# Altium integrated library Altium_MCU.IntLib: 42 symbols
Pins are listed as number, name and electrical type; pins without a type are passive.

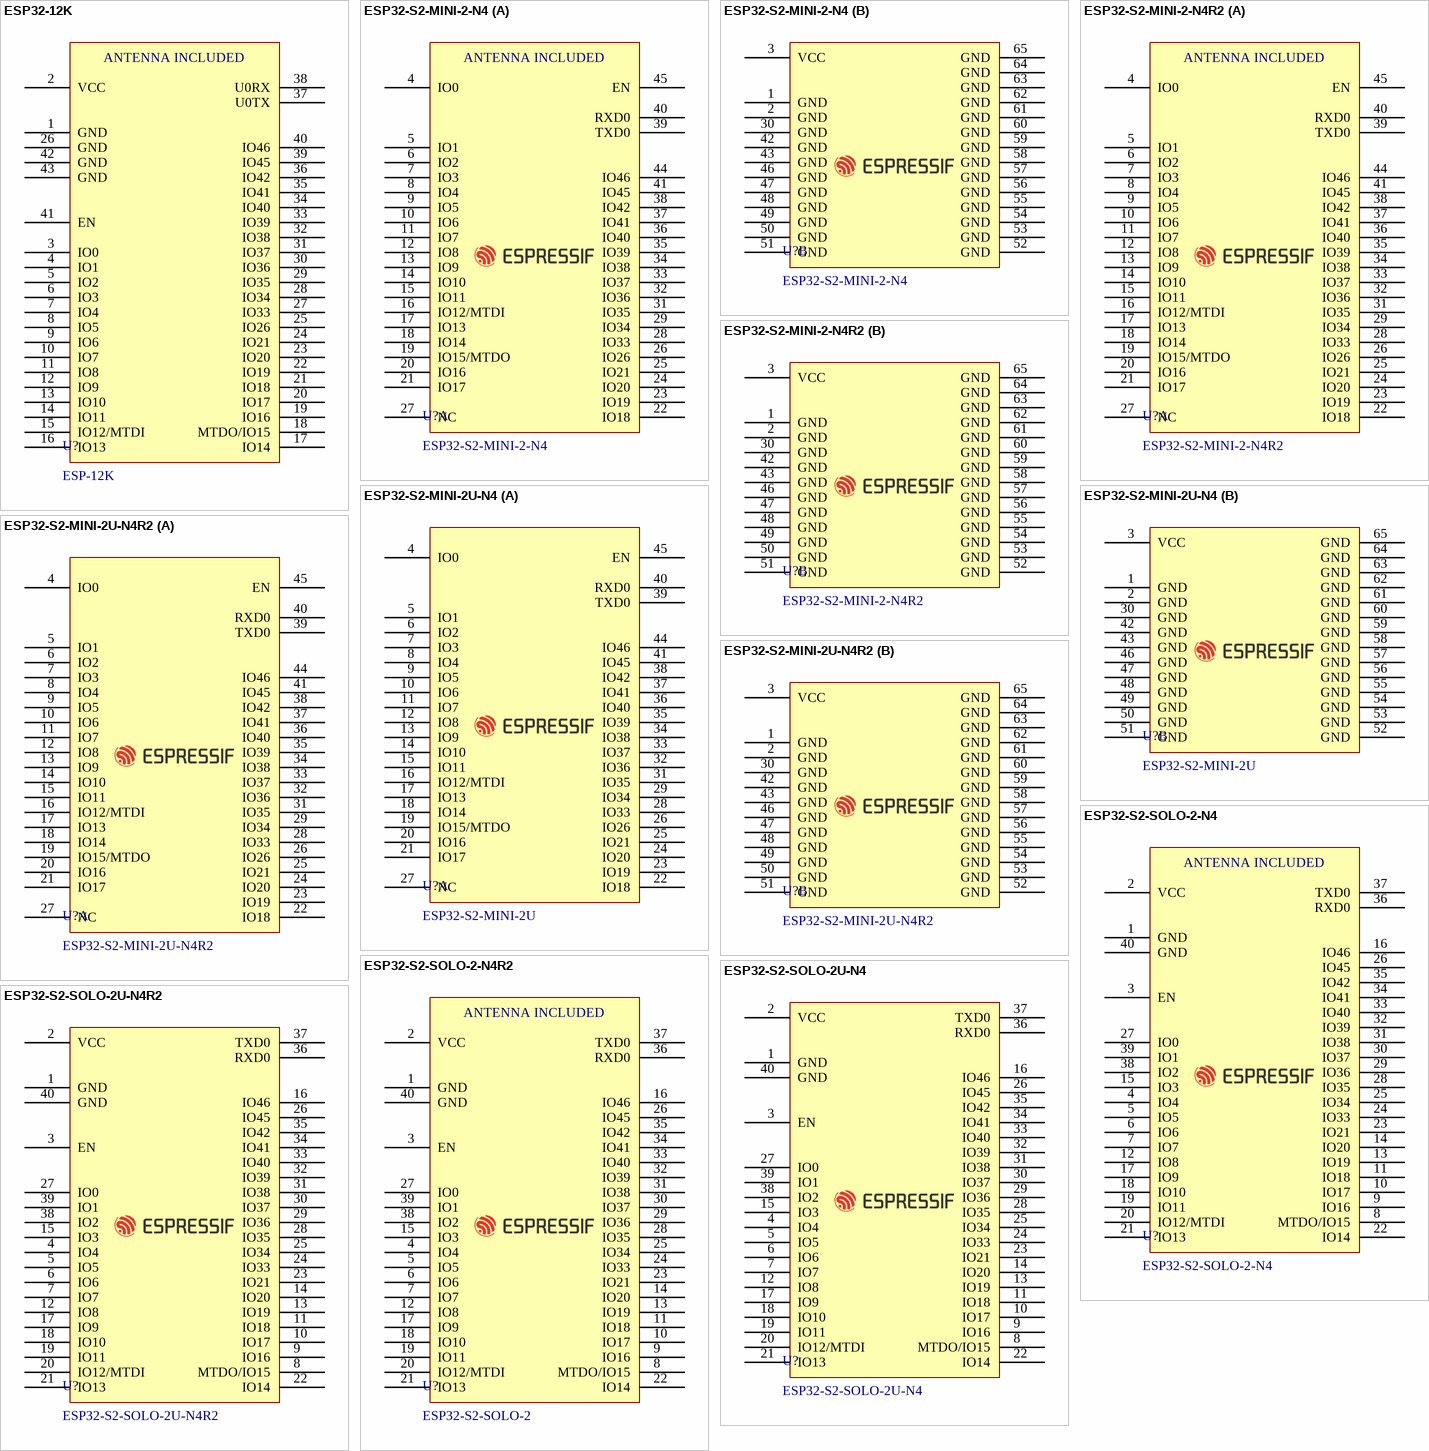
[diagram p0: symbols ESP32-12K to ESP32-S2-SOLO-2U-N4R2]

## ESP32-12K
designator U?, comment ESP-12K
ESP32-S2; Manufacturer: AI-Thinker; Supply Voltage - Max: 3.6 V; Supply Voltage - Min: 3 V; Part Number: ESP-12K; Supplier 1 URL: N/A; Supplier 2 URL: N/A; Supplier 3 URL: https://www.thegioiic.com/esp-12k-8m-psram-esp8266-ai-thinker-mach-thu-phat-wifi; Value: ESP-12K; Manufacturer Part Number: ESP-12K; Packaging: Tape and Reel; Supplier 1: Mouser; Supplier 1 Part Number: N/A; Supplier 2: Digi-Key; Supplier 2 Part Number: N/A; Supplier 3: thegioiic; Supplier 3 Part Number: ESP-12K; Mount: SMD/SMT; Operating Temperature Max: + 85 C; Operating Temperature Min: - 40 C; ComponentLink1Description: Datasheet; ComponentLink1URL: N/A; LCSC Part #: N/A; Flash size: N/A; Ram size: N/A
footprint ESP32-12K (Chip Array, Concave, 41-Leads, Pitch 1.50mm,  Body 31.00x18.00mm,  IPC Medium Density)
pins: 1 GND, 2 VCC, 3 IO0, 4 IO1, 5 IO2, 6 IO3, 7 IO4, 8 IO5, 9 IO6, 10 IO7, 11 IO8, 12 IO9, 13 IO10, 14 IO11, 15 IO12/MTDI, 16 IO13, 17 IO14, 18 MTDO/IO15, 19 IO16, 20 IO17, 21 IO18, 22 IO19, 23 IO20, 24 IO21, 25 IO26, 26 GND, 27 IO33, 28 IO34, 29 IO35, 30 IO36, 31 IO37, 32 IO38, 33 IO39, 34 IO40, 35 IO41, 36 IO42, 37 U0TX, 38 U0RX, 39 IO45, 40 IO46, 41 EN, 42 GND, 43 GND
text: ANTENNA INCLUDED

## ESP32-S2-MINI-2-N4
designator U?
ESP32-S2 embedded, Xtensa® single-core 32-bit LX7 microprocessor, up to 240 MHz; Part Number: ESP32-S2-MINI-2-N4A; Manufacturer: Espressif Systems; Supply Voltage - Max: 3.6 V; Supply Voltage - Min: 3 V; Flash size: 4MB; Supplier 1 URL: https://www.mouser.com/ProductDetail/Espressif-Systems/ESP32-S2-MINI-2-N4?qs=sGAEpiMZZMu3sxpa5v1qrjXjSzkapvOOr/iFVzmZzOw%3D; Supplier 2 URL: https://www.digikey.cn/en/products/detail/espressif-systems/ESP32-S2-MINI-2-N4/16591891; Supplier 3 URL: N/A; Value: ESP32-S2-MINI-2-N4; Manufacturer Part Number: ESP32-S2-MINI-2-N4; Packaging: Tape and Reel; Supplier 1: Mouser; Supplier 1 Part Number: 356-ESP32MINI-2-N4; Supplier 2: Digi-Key; Supplier 2 Part Number: 1965-ESP32-S2-MINI-2-N4CT-ND; Supplier 3: thegioiic; Supplier 3 Part Number: N/A; Mount: SMD/SMT; Operating Temperature Max: + 85 C; Operating Temperature Min: - 40 C; ComponentLink1Description: Datasheet; ComponentLink1URL: https://www.mouser.com/datasheet/2/891/Espressif_Systems_7_27_2022_ESP32_S2_MINI_22U_EN_V-3002662.pdf; LCSC Part #: N/A; Ram size: N/A
footprint ESP32_MINI_OB_ANTENNA
part A pins: 4 IO0, 5 IO1, 6 IO2, 7 IO3, 8 IO4, 9 IO5, 10 IO6, 11 IO7, 12 IO8, 13 IO9, 14 IO10, 15 IO11, 16 IO12/MTDI, 17 IO13, 18 IO14, 19 IO15/MTDO, 20 IO16, 21 IO17, 22 IO18, 23 IO19, 24 IO20, 25 IO21, 26 IO26, 27 NC, 28 IO33, 29 IO34, 31 IO35, 32 IO36, 33 IO37, 34 IO38, 35 IO39, 36 IO40, 37 IO41, 38 IO42, 39 TXD0, 40 RXD0, 41 IO45, 44 IO46, 45 EN
part B pins: 1 GND, 2 GND, 3 VCC, 30 GND, 42 GND, 43 GND, 46 GND, 47 GND, 48 GND, 49 GND, 50 GND, 51 GND, 52 GND, 53 GND, 54 GND, 55 GND, 56 GND, 57 GND, 58 GND, 59 GND, 60 GND, 61 GND, 62 GND, 63 GND, 64 GND, 65 GND
part A text: ANTENNA INCLUDED

## ESP32-S2-MINI-2-N4R2
designator U?
ESP32-S2 embedded, Xtensa® single-core 32-bit LX7 microprocessor, up to 240 MHz; Part Number: ESP32-S2-MINI-2-N4R2A; Manufacturer: Espressif Systems; Supply Voltage - Max: 3.6 V; Supply Voltage - Min: 3 V; Flash size: 4MB; Ram size: 2MB; Supplier 1 URL: https://www.mouser.com/ProductDetail/Espressif-Systems/ESP32-S2-MINI-2-N4R2?qs=sGAEpiMZZMu3sxpa5v1qrjXjSzkapvOOJC9Dptg9ErI%3D; Supplier 2 URL: https://www.digikey.cn/en/products/detail/espressif-systems/ESP32-S2-MINI-2-N4R2/16591895; Supplier 3 URL: N/A; Value: ESP32-S2-MINI-2-N4R2; Manufacturer Part Number: ESP32-S2-MINI-2-N4R2; Packaging: Tape and Reel; Supplier 1: Mouser; Supplier 1 Part Number: ESP32-S2-MINI-2-N4R2; Supplier 2: Digi-Key; Supplier 2 Part Number: 1965-ESP32-S2-MINI-2-N4R2-ND; Supplier 3: thegioiic; Supplier 3 Part Number: N/A; Mount: SMD/SMT; Operating Temperature Max: + 85 C; Operating Temperature Min: - 40 C; ComponentLink1Description: Datasheet; ComponentLink1URL: https://www.mouser.com/datasheet/2/891/Espressif_Systems_7_27_2022_ESP32_S2_MINI_22U_EN_V-3002662.pdf; LCSC Part #: N/A
footprint ESP32_MINI_OB_ANTENNA
part A pins: 4 IO0, 5 IO1, 6 IO2, 7 IO3, 8 IO4, 9 IO5, 10 IO6, 11 IO7, 12 IO8, 13 IO9, 14 IO10, 15 IO11, 16 IO12/MTDI, 17 IO13, 18 IO14, 19 IO15/MTDO, 20 IO16, 21 IO17, 22 IO18, 23 IO19, 24 IO20, 25 IO21, 26 IO26, 27 NC, 28 IO33, 29 IO34, 31 IO35, 32 IO36, 33 IO37, 34 IO38, 35 IO39, 36 IO40, 37 IO41, 38 IO42, 39 TXD0, 40 RXD0, 41 IO45, 44 IO46, 45 EN
part B pins: 1 GND, 2 GND, 3 VCC, 30 GND, 42 GND, 43 GND, 46 GND, 47 GND, 48 GND, 49 GND, 50 GND, 51 GND, 52 GND, 53 GND, 54 GND, 55 GND, 56 GND, 57 GND, 58 GND, 59 GND, 60 GND, 61 GND, 62 GND, 63 GND, 64 GND, 65 GND
part A text: ANTENNA INCLUDED

## ESP32-S2-MINI-2U-N4
designator U?, comment ESP32-S2-MINI-2U
ESP32-S2 embedded, Xtensa® single-core 32-bit LX7 microprocessor, up to 240 MHz; Part Number: ESP32-S2-MINI-2U-N4A; Manufacturer: Espressif Systems; Manufacturer Part Number: ESP32-S2-MINI-2U-N4; Supply Voltage - Max: 3.6 V; Supply Voltage - Min: 3 V; Flash size: 4MB; Supplier 1 URL: https://www.mouser.com/ProductDetail/Espressif-Systems/ESP32-S2-MINI-2U-N4?qs=sGAEpiMZZMu3sxpa5v1qrjXjSzkapvOOhy01huix4lM%3D; Supplier 2 URL: N/A; Supplier 3 URL: N/A; Value: ESP32-S2-MINI-2U; Packaging: Tape and Reel; Supplier 1: Mouser; Supplier 1 Part Number: 356-ESP32MINI-2U-N4; Supplier 2: Digi-Key; Supplier 2 Part Number: N/A; Supplier 3: thegioiic; Supplier 3 Part Number: N/A; Mount: SMD/SMT; Operating Temperature Max: + 85 C; Operating Temperature Min: - 40 C; ComponentLink1Description: Datasheet; ComponentLink1URL: https://www.mouser.com/datasheet/2/891/Espressif_Systems_7_27_2022_ESP32_S2_MINI_22U_EN_V-3002662.pdf; LCSC Part #: N/A; Ram size: N/A
footprint ESP32_MINI
part A pins: 4 IO0, 5 IO1, 6 IO2, 7 IO3, 8 IO4, 9 IO5, 10 IO6, 11 IO7, 12 IO8, 13 IO9, 14 IO10, 15 IO11, 16 IO12/MTDI, 17 IO13, 18 IO14, 19 IO15/MTDO, 20 IO16, 21 IO17, 22 IO18, 23 IO19, 24 IO20, 25 IO21, 26 IO26, 27 NC, 28 IO33, 29 IO34, 31 IO35, 32 IO36, 33 IO37, 34 IO38, 35 IO39, 36 IO40, 37 IO41, 38 IO42, 39 TXD0, 40 RXD0, 41 IO45, 44 IO46, 45 EN
part B pins: 1 GND, 2 GND, 3 VCC, 30 GND, 42 GND, 43 GND, 46 GND, 47 GND, 48 GND, 49 GND, 50 GND, 51 GND, 52 GND, 53 GND, 54 GND, 55 GND, 56 GND, 57 GND, 58 GND, 59 GND, 60 GND, 61 GND, 62 GND, 63 GND, 64 GND, 65 GND

## ESP32-S2-MINI-2U-N4R2
designator U?
ESP32-S2 embedded, Xtensa® single-core 32-bit LX7 microprocessor, up to 240 MHz; Part Number: ESP32-S2-MINI-2U-N4R2A; Manufacturer: Espressif Systems; Supply Voltage - Max: 3.6 V; Supply Voltage - Min: 3 V; Flash size: 4MB; Ram size: 2MB; Supplier 1 URL: https://www.mouser.com/ProductDetail/Espressif-Systems/ESP32-S2-MINI-2U-N4R2?qs=sGAEpiMZZMu3sxpa5v1qrjXjSzkapvOOZRm3ki/1tDs%3D; Supplier 2 URL: https://www.digikey.cn/en/products/detail/espressif-systems/ESP32-S2-MINI-2U-N4R2/16591889; Supplier 3 URL: N/A; Value: ESP32-S2-MINI-2U-N4R2; Manufacturer Part Number: ESP32-S2-MINI-2U-N4R2; Packaging: Tape and Reel; Supplier 1: Mouser; Supplier 1 Part Number: 356-ESP32MINI2U-N4R2; Supplier 2: Digi-Key; Supplier 2 Part Number: 1965-ESP32-S2-MINI-2U-N4R2-ND; Supplier 3: thegioiic; Supplier 3 Part Number: N/A; Mount: SMD/SMT; Operating Temperature Max: + 85 C; Operating Temperature Min: - 40 C; ComponentLink1Description: Datasheet; ComponentLink1URL: https://www.mouser.com/datasheet/2/891/Espressif_Systems_7_27_2022_ESP32_S2_MINI_22U_EN_V-3002662.pdf; LCSC Part #: N/A
footprint ESP32_MINI
part A pins: 4 IO0, 5 IO1, 6 IO2, 7 IO3, 8 IO4, 9 IO5, 10 IO6, 11 IO7, 12 IO8, 13 IO9, 14 IO10, 15 IO11, 16 IO12/MTDI, 17 IO13, 18 IO14, 19 IO15/MTDO, 20 IO16, 21 IO17, 22 IO18, 23 IO19, 24 IO20, 25 IO21, 26 IO26, 27 NC, 28 IO33, 29 IO34, 31 IO35, 32 IO36, 33 IO37, 34 IO38, 35 IO39, 36 IO40, 37 IO41, 38 IO42, 39 TXD0, 40 RXD0, 41 IO45, 44 IO46, 45 EN
part B pins: 1 GND, 2 GND, 3 VCC, 30 GND, 42 GND, 43 GND, 46 GND, 47 GND, 48 GND, 49 GND, 50 GND, 51 GND, 52 GND, 53 GND, 54 GND, 55 GND, 56 GND, 57 GND, 58 GND, 59 GND, 60 GND, 61 GND, 62 GND, 63 GND, 64 GND, 65 GND

## ESP32-S2-SOLO-2-N4
designator U?
ESP32-S2 embedded, Xtensa® single-core 32-bit LX7 microprocessor, up to 240 MHz; Manufacturer: Espressif Systems; Supply Voltage - Max: 3.6 V; Supply Voltage - Min: 3 V; Flash size: 4MB; Part Number: ESP32-S2-SOLO-2-N4; Supplier 1 URL: https://www.mouser.com/ProductDetail/Espressif-Systems/ESP32-S2-SOLO-2-N4?qs=sGAEpiMZZMu3sxpa5v1qrjXjSzkapvOOEC88hoUZJyA%3D; Supplier 2 URL: https://www.digikey.cn/en/products/detail/espressif-systems/ESP32-S2-SOLO-2-N4/16591892; Supplier 3 URL: N/A; Value: ESP32-S2-SOLO-2-N4; Manufacturer Part Number: ESP32-S2-SOLO-2-N4; Packaging: Tape and Reel; Supplier 1: Mouser; Supplier 1 Part Number: 356-ESP32SOLO-2-N4; Supplier 2: Digi-Key; Supplier 2 Part Number: 1965-ESP32-S2-SOLO-2-N4CT-ND; Supplier 3: thegioiic; Supplier 3 Part Number: N/A; Mount: SMD/SMT; Operating Temperature Max: + 85 C; Operating Temperature Min: - 40 C; ComponentLink1Description: Datasheet; ComponentLink1URL: https://www.mouser.com/datasheet/2/891/Espressif_Systems_7_27_2022_ESP32_S2_SOLO_22U_EN_v-3002658.pdf; LCSC Part #: N/A; Ram size: N/A
footprint ESP32_SOLO_OB_ANTENNA
pins: 1 GND, 2 VCC, 3 EN, 4 IO4, 5 IO5, 6 IO6, 7 IO7, 8 MTDO/IO15, 9 IO16, 10 IO17, 11 IO18, 12 IO8, 13 IO19, 14 IO20, 15 IO3, 16 IO46, 17 IO9, 18 IO10, 19 IO11, 20 IO12/MTDI, 21 IO13, 22 IO14, 23 IO21, 24 IO33, 25 IO34, 26 IO45, 27 IO0, 28 IO35, 29 IO36, 30 IO37, 31 IO38, 32 IO39, 33 IO40, 34 IO41, 35 IO42, 36 RXD0, 37 TXD0, 38 IO2, 39 IO1, 40 GND
text: ANTENNA INCLUDED

## ESP32-S2-SOLO-2-N4R2
designator U?, comment ESP32-S2-SOLO-2
ESP32-S2 embedded, Xtensa® single-core 32-bit LX7 microprocessor, up to 240 MHz; Part Number: ESP32-S2-SOLO-2-N4R2; Manufacturer: Espressif Systems; Supply Voltage - Max: 3.6 V; Supply Voltage - Min: 3 V; Flash size: 4MB; Ram size: 2MB; Supplier 1 URL: https://www.mouser.com/ProductDetail/Espressif-Systems/ESP32-S2-SOLO-2-N4R2?qs=sGAEpiMZZMu3sxpa5v1qrjXjSzkapvOO3gwRcSEsnoY%3D; Supplier 2 URL: https://www.digikey.cn/en/products/detail/espressif-systems/ESP32-S2-SOLO-2-N4R2/16591896; Supplier 3 URL: N/A; Value: ESP32-S2-SOLO-2; Manufacturer Part Number: ESP32-S2-SOLO-2-N4R2; Packaging: Tape and Reel; Supplier 1: Mouser; Supplier 1 Part Number: 356-ESP32SOLO-2-N4R2; Supplier 2: Digi-Key; Supplier 2 Part Number: 1965-ESP32-S2-SOLO-2-N4R2TR-ND; Supplier 3: thegioiic; Supplier 3 Part Number: N/A; Mount: SMD/SMT; Operating Temperature Max: + 85 C; Operating Temperature Min: - 40 C; ComponentLink1Description: Datasheet; ComponentLink1URL: https://www.mouser.com/datasheet/2/891/Espressif_Systems_7_27_2022_ESP32_S2_SOLO_22U_EN_v-3002658.pdf; LCSC Part #: N/A
footprint ESP32_SOLO_OB_ANTENNA
pins: 1 GND, 2 VCC, 3 EN, 4 IO4, 5 IO5, 6 IO6, 7 IO7, 8 MTDO/IO15, 9 IO16, 10 IO17, 11 IO18, 12 IO8, 13 IO19, 14 IO20, 15 IO3, 16 IO46, 17 IO9, 18 IO10, 19 IO11, 20 IO12/MTDI, 21 IO13, 22 IO14, 23 IO21, 24 IO33, 25 IO34, 26 IO45, 27 IO0, 28 IO35, 29 IO36, 30 IO37, 31 IO38, 32 IO39, 33 IO40, 34 IO41, 35 IO42, 36 RXD0, 37 TXD0, 38 IO2, 39 IO1, 40 GND
text: ANTENNA INCLUDED

## ESP32-S2-SOLO-2U-N4
designator U?
ESP32-S2 embedded, Xtensa® single-core 32-bit LX7 microprocessor, up to 240 MHz; Manufacturer: Espressif Systems; Supply Voltage - Max: 3.6 V; Supply Voltage - Min: 3 V; Flash size: 4MB; Part Number: ESP32-S2-SOLO-2U-N4; Supplier 1 URL: https://www.mouser.com/ProductDetail/Espressif-Systems/ESP32-S2-SOLO-2U-N4?qs=sGAEpiMZZMu3sxpa5v1qrjXjSzkapvOOhwzZOR2/Xv4%3D; Supplier 2 URL: https://www.digikey.cn/en/products/detail/espressif-systems/ESP32-S2-SOLO-2U-N4/16591894; Supplier 3 URL: N/A; Value: ESP32-S2-SOLO-2U-N4; Manufacturer Part Number: ESP32-S2-SOLO-2U-N4; Packaging: Tape and Reel; Supplier 1: Mouser; Supplier 1 Part Number: 356-ESP32SOLO-2U-N4; Supplier 2: Digi-Key; Supplier 2 Part Number: 1965-ESP32-S2-SOLO-2U-N4CT-ND; Supplier 3: thegioiic; Supplier 3 Part Number: N/A; Mount: SMD/SMT; Operating Temperature Max: + 85 C; Operating Temperature Min: - 40 C; ComponentLink1Description: Datasheet; ComponentLink1URL: https://www.mouser.com/datasheet/2/891/Espressif_Systems_7_27_2022_ESP32_S2_SOLO_22U_EN_v-3002658.pdf; LCSC Part #: N/A; Ram size: N/A
footprint ESP32_SOLO
pins: 1 GND, 2 VCC, 3 EN, 4 IO4, 5 IO5, 6 IO6, 7 IO7, 8 MTDO/IO15, 9 IO16, 10 IO17, 11 IO18, 12 IO8, 13 IO19, 14 IO20, 15 IO3, 16 IO46, 17 IO9, 18 IO10, 19 IO11, 20 IO12/MTDI, 21 IO13, 22 IO14, 23 IO21, 24 IO33, 25 IO34, 26 IO45, 27 IO0, 28 IO35, 29 IO36, 30 IO37, 31 IO38, 32 IO39, 33 IO40, 34 IO41, 35 IO42, 36 RXD0, 37 TXD0, 38 IO2, 39 IO1, 40 GND

## ESP32-S2-SOLO-2U-N4R2
designator U?
ESP32-S2 embedded, Xtensa® single-core 32-bit LX7 microprocessor, up to 240 MHz; Manufacturer: Espressif Systems; Supply Voltage - Max: 3.6 V; Supply Voltage - Min: 3 V; Flash size: 4MB; Ram size: 2MB; Part Number: ESP32-S2-SOLO-2U-N4R2; Supplier 1 URL: https://www.mouser.com/ProductDetail/Espressif-Systems/ESP32-S2-SOLO-2U-N4R2?qs=sGAEpiMZZMu3sxpa5v1qrjXjSzkapvOO/wRv9SAyZyc%3D; Supplier 2 URL: https://www.digikey.cn/en/products/detail/espressif-systems/esp32-s2-solo-2u-n4r2/16591890; Supplier 3 URL: N/A; Value: ESP32-S2-SOLO-2U-N4R2; Manufacturer Part Number: ESP32-S2-SOLO-2U-N4R2; Packaging: Tape and Reel; Supplier 1: Mouser; Supplier 1 Part Number: 356-ESP32SOLO2U-N4R2; Supplier 2: Digi-Key; Supplier 2 Part Number: 1965-ESP32-S2-SOLO-2U-N4R2CT-ND; Supplier 3: thegioiic; Supplier 3 Part Number: N/A; Mount: SMD/SMT; Operating Temperature Max: + 85 C; Operating Temperature Min: - 40 C; ComponentLink1Description: Datasheet; ComponentLink1URL: https://www.mouser.com/datasheet/2/891/Espressif_Systems_7_27_2022_ESP32_S2_SOLO_22U_EN_v-3002658.pdf; LCSC Part #: N/A
footprint ESP32_SOLO
pins: 1 GND, 2 VCC, 3 EN, 4 IO4, 5 IO5, 6 IO6, 7 IO7, 8 MTDO/IO15, 9 IO16, 10 IO17, 11 IO18, 12 IO8, 13 IO19, 14 IO20, 15 IO3, 16 IO46, 17 IO9, 18 IO10, 19 IO11, 20 IO12/MTDI, 21 IO13, 22 IO14, 23 IO21, 24 IO33, 25 IO34, 26 IO45, 27 IO0, 28 IO35, 29 IO36, 30 IO37, 31 IO38, 32 IO39, 33 IO40, 34 IO41, 35 IO42, 36 RXD0, 37 TXD0, 38 IO2, 39 IO1, 40 GND

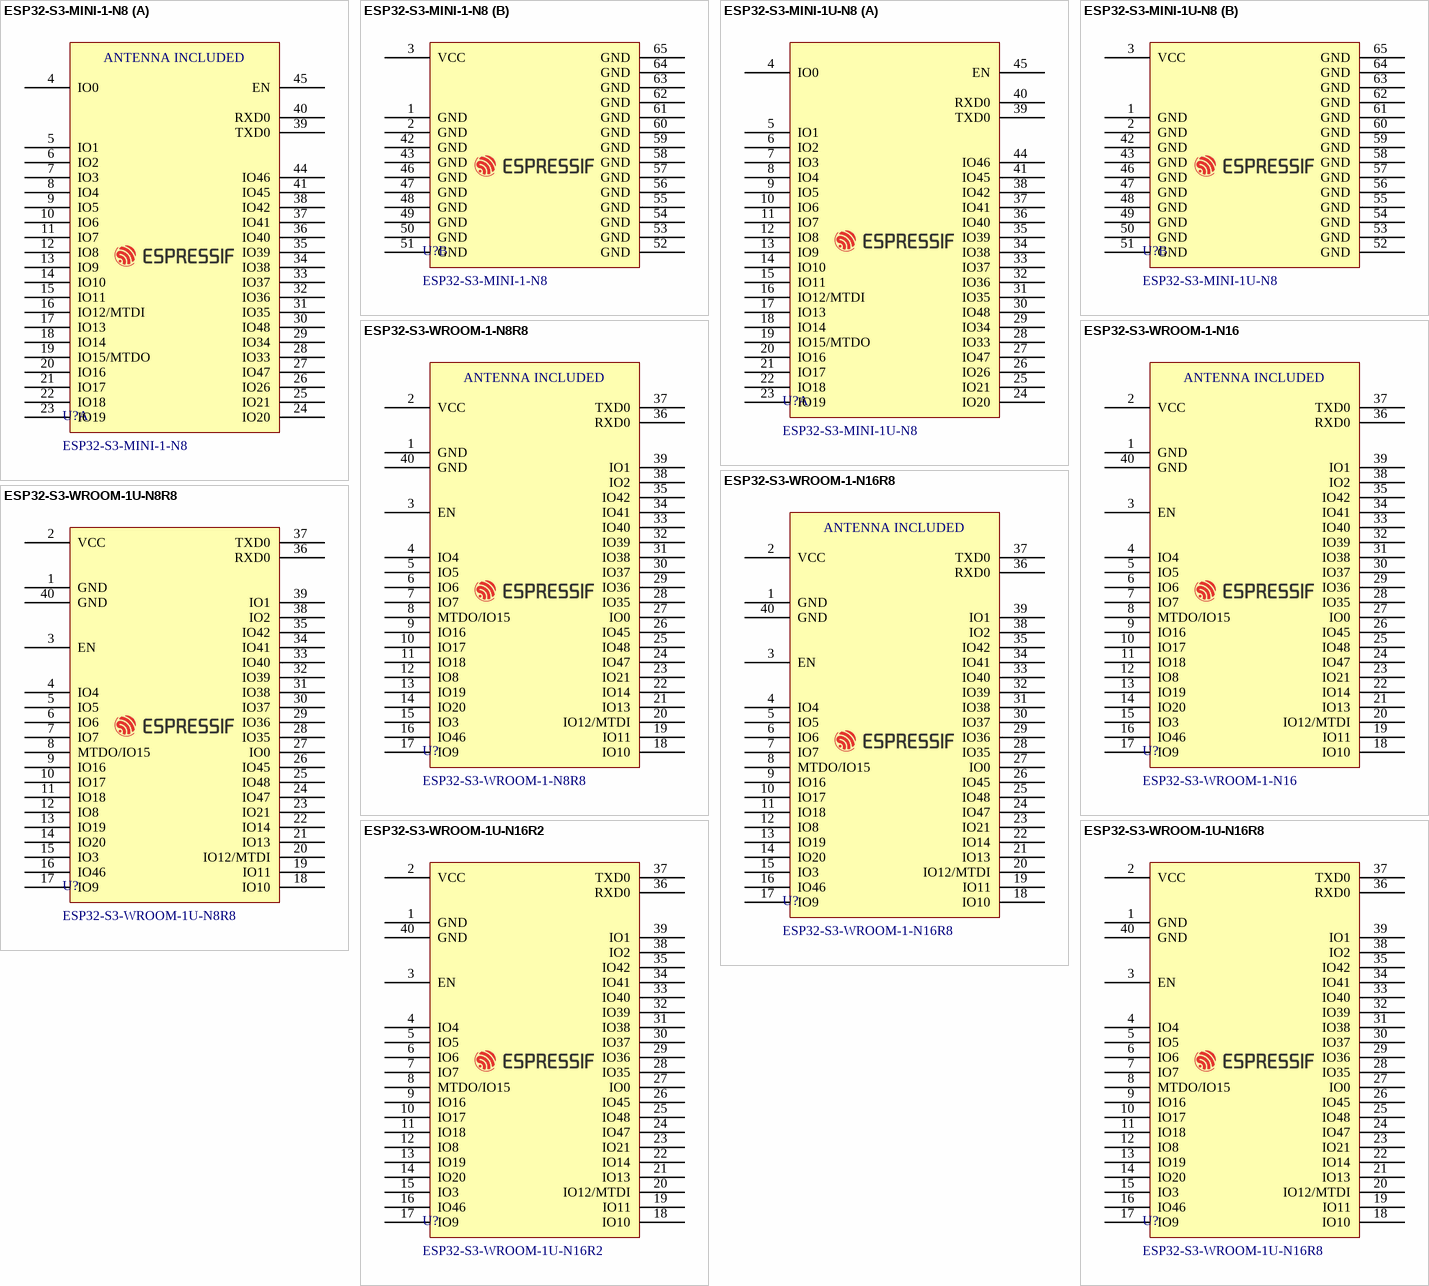
[diagram p1: symbols ESP32-S3-MINI-1-N8 to ESP32-S3-WROOM-1U-N16R8]

## ESP32-S3-MINI-1-N8
designator U?
Xtensa® 32-bit LX7 dual-core processor that operates at up to 240 MHz; Part Number: ESP32-S3-MINI-1-N8A; Manufacturer: Espressif Systems; Supply Voltage - Max: 3.6 V; Supply Voltage - Min: 3 V; Flash size: 8MB; Supplier 1 URL: https://www.mouser.com/ProductDetail/Espressif-Systems/ESP32-S3-MINI-1-N8?qs=XAiT9M5g4x82rl6F/IYUQg%3D%3D&utm_source=mouser-refine-download&utm_medium=file&utm_campaign=ESP32-S3-MINI-1-N8&utm_content=Espressif-Systems; Supplier 2 URL: https://www.digikey.com/en/products/detail/espressif-systems/ESP32-S3-MINI-1-N8/15295890; Supplier 3 URL: N/A; Value: ESP32-S3-MINI-1-N8; Manufacturer Part Number: ESP32-S3-MINI-1-N8; Packaging: Tape and Reel; Supplier 1: Mouser; Supplier 1 Part Number: 356-ESP32-S3-MINI1N8; Supplier 2: Digi-Key; Supplier 2 Part Number: 1965-ESP32-S3-MINI-1-N8-ND; Supplier 3: thegioiic; Supplier 3 Part Number: N/A; Mount: SMD/SMT; Operating Temperature Max: + 85 C; Operating Temperature Min: - 40 C; ComponentLink1Description: Datasheet; ComponentLink1URL: https://www.mouser.com/datasheet/2/891/esp32_s3_mini_1_mini_1u_datasheet_en-2997643.pdf; LCSC Part #: N/A; Ram size: N/A
footprint ESP32_MINI_OB_ANTENNA
part A pins: 4 IO0, 5 IO1, 6 IO2, 7 IO3, 8 IO4, 9 IO5, 10 IO6, 11 IO7, 12 IO8, 13 IO9, 14 IO10, 15 IO11, 16 IO12/MTDI, 17 IO13, 18 IO14, 19 IO15/MTDO, 20 IO16, 21 IO17, 22 IO18, 23 IO19, 24 IO20, 25 IO21, 26 IO26, 27 IO47, 28 IO33, 29 IO34, 30 IO48, 31 IO35, 32 IO36, 33 IO37, 34 IO38, 35 IO39, 36 IO40, 37 IO41, 38 IO42, 39 TXD0, 40 RXD0, 41 IO45, 44 IO46, 45 EN
part B pins: 1 GND, 2 GND, 3 VCC, 42 GND, 43 GND, 46 GND, 47 GND, 48 GND, 49 GND, 50 GND, 51 GND, 52 GND, 53 GND, 54 GND, 55 GND, 56 GND, 57 GND, 58 GND, 59 GND, 60 GND, 61 GND, 62 GND, 63 GND, 64 GND, 65 GND
part A text: ANTENNA INCLUDED

## ESP32-S3-MINI-1U-N8
designator U?
Xtensa® 32-bit LX7 dual-core processor that operates at up to 240 MHz; Part Number: ESP32-S3-MINI-1U-N8A; Manufacturer: Espressif Systems; Supply Voltage - Max: 3.6 V; Supply Voltage - Min: 3 V; Flash size: 8MB; Supplier 1 URL: https://www.mouser.com/ProductDetail/Espressif-Systems/ESP32-S3-MINI-1U-N8?qs=IPgv5n7u5QZ2yjt9dMz22g%3D%3D; Supplier 2 URL: https://www.digikey.com/en/products/detail/espressif-systems/ESP32-S3-MINI-1U-N8/17728863?s=N4IgTCBcDaIKIGUAKBmMBaBL0FkCSAcnugIwCq6BAHCALoC%2BQA; Supplier 3 URL: N/A; Value: ESP32-S3-MINI-1U-N8; Manufacturer Part Number: ESP32-S3-MINI-1U-N8; Packaging: Tape and Reel; Supplier 1: Mouser; Supplier 1 Part Number: 356-ESP32S3MINI1UN8; Supplier 2: Digi-Key; Supplier 2 Part Number: 1965-ESP32-S3-MINI-1U-N8TR-ND; Supplier 3: thegioiic; Supplier 3 Part Number: N/A; Mount: SMD/SMT; Operating Temperature Max: + 85 C; Operating Temperature Min: - 40 C; ComponentLink1Description: Datasheet; ComponentLink1URL: https://www.mouser.com/datasheet/2/891/esp32_s3_mini_1_mini_1u_datasheet_en-2997643.pdf; LCSC Part #: N/A; Ram size: N/A
footprint ESP32_MINI
part A pins: 4 IO0, 5 IO1, 6 IO2, 7 IO3, 8 IO4, 9 IO5, 10 IO6, 11 IO7, 12 IO8, 13 IO9, 14 IO10, 15 IO11, 16 IO12/MTDI, 17 IO13, 18 IO14, 19 IO15/MTDO, 20 IO16, 21 IO17, 22 IO18, 23 IO19, 24 IO20, 25 IO21, 26 IO26, 27 IO47, 28 IO33, 29 IO34, 30 IO48, 31 IO35, 32 IO36, 33 IO37, 34 IO38, 35 IO39, 36 IO40, 37 IO41, 38 IO42, 39 TXD0, 40 RXD0, 41 IO45, 44 IO46, 45 EN
part B pins: 1 GND, 2 GND, 3 VCC, 42 GND, 43 GND, 46 GND, 47 GND, 48 GND, 49 GND, 50 GND, 51 GND, 52 GND, 53 GND, 54 GND, 55 GND, 56 GND, 57 GND, 58 GND, 59 GND, 60 GND, 61 GND, 62 GND, 63 GND, 64 GND, 65 GND

## ESP32-S3-WROOM-1-N8R8
designator U?
Xtensa® 32-bit LX7 dual-core processor that operates at up to 240 MHz; Manufacturer: Espressif Systems; Supply Voltage - Max: 3.6 V; Supply Voltage - Min: 3 V; Flash size: 8MB; Part Number: ESP32-S3-WROOM-1-N8R8; Supplier 1 URL: N/A; Supplier 2 URL: https://www.digikey.com/en/products/detail/espressif-systems/ESP32-S3-WROOM-1-N8R8/15295891; Supplier 3 URL: N/A; Value: ESP32-S3-WROOM-1-N8R8; Manufacturer Part Number: ESP32-S3-WROOM-1-N8R8; Packaging: Tape and Reel; Supplier 1: Mouser; Supplier 1 Part Number: N/A; Supplier 2: Digi-Key; Supplier 2 Part Number: 1965-ESP32-S3-WROOM-1-N8R8CT-ND; Supplier 3: thegioiic; Supplier 3 Part Number: N/A; Mount: SMD/SMT; Operating Temperature Max: + 85 C; Operating Temperature Min: - 40 C; ComponentLink1Description: Datasheet; ComponentLink1URL: https://www.mouser.com/datasheet/2/891/esp32_s3_wroom_1_wroom_1u_datasheet_en-2930317.pdf; LCSC Part #: C2913201; Ram size: 8MB
footprint ESP32_SOLO_OB_ANTENNA
pins: 1 GND, 2 VCC, 3 EN, 4 IO4, 5 IO5, 6 IO6, 7 IO7, 8 MTDO/IO15, 9 IO16, 10 IO17, 11 IO18, 12 IO8, 13 IO19, 14 IO20, 15 IO3, 16 IO46, 17 IO9, 18 IO10, 19 IO11, 20 IO12/MTDI, 21 IO13, 22 IO14, 23 IO21, 24 IO47, 25 IO48, 26 IO45, 27 IO0, 28 IO35, 29 IO36, 30 IO37, 31 IO38, 32 IO39, 33 IO40, 34 IO41, 35 IO42, 36 RXD0, 37 TXD0, 38 IO2, 39 IO1, 40 GND
text: ANTENNA INCLUDED
